# Altium integrated library Hoovic_Library.IntLib: 194 symbols (continued)
## Header 9
designator P?  (value not drawn)
连接器, 9-Pin
footprint CONN-TH_9P-2.54-DIR
footprint CONN-TH_9P-P2.00_PH-8AW
pins: 1, 2, 3, 4, 5, 6, 7, 8, 9

## Header 10
designator P?  (value not drawn)
连接器, 10-Pin
footprint BatCon_10PIN_2.5mm
footprint CONN-TH_10P-2.54-DIR
footprint BatCon_10PIN_2.5mm_MAL
pins: 1, 2, 3, 4, 5, 6, 7, 8, 9, 10

## Header 11
designator P?  (value not drawn)
连接器, 11-Pin
footprint BatCon_11PIN_2.5mm
footprint BatCon_11PIN_2.5mm_MAL
pins: 1, 2, 3, 4, 5, 6, 7, 8, 9, 10, 11

## Header 12
designator P?  (value not drawn)
连接器, 12-Pin
footprint BatCon_12PIN_2.5mm
footprint BatCon_12PIN_2.5mm_MAL
pins: 1, 2, 3, 4, 5, 6, 7, 8, 9, 10, 11, 12

## Header 20
designator P?  (value not drawn)
连接器, 20-Pin
footprint CONN-TH_20P-2.54-DIR
pins: 1, 2, 3, 4, 5, 6, 7, 8, 9, 10, 11, 12, 13, 14, 15, 16, 17, 18, 19, 20

## HF2150-1A-5DE
designator K?  (value not drawn)
继电器 5VDC (277VAC , 30VDC) Max Power Relay
footprint RELAY-TH_HF2150-1A
footprint RELAY-TH_YX202-S-105DM
pins: 1, 2, 3, 4

## HT7533
designator U?
电源芯片 Vin=30V Vout=3.3V 100mA
footprint SOT-89
pins: 1 GND, 2 IN, 3 OUT

## Inductor
designator L?, comment 10nH 300mA ±5%  (value not drawn)
电感
footprint R0402
footprint R0603
footprint R0805
pins: 1, 2

## Inductor Iron
designator L?, comment 220uH 1.5A ±20%  (value not drawn)
功率电感
footprint IND2520
footprint IND3015
footprint IND1207
footprint IND5020
footprint T050125 (7mm_Inductor)
footprint IND6045
footprint IND8065
footprint IND_BD17-D10-P5.5MM
pins: 1, 2

## KSZ8081RNBIA-TR
designator U?
10BASE-T/100BASE-TX Physical Layer / Transceiver
footprint QFN32-0.5_5x5MM
pins: 0 PADDLE, 1 GND, 2 VDD_1.2, 3 VDDA_3.3, 4 RXM, 5 RXP, 6 TXM, 7 TXP, 8 XO, 9 XI, 10 REXT, 11 MDIO, 12 MDC, 13 PHYAD0, 14 PHYAD1, 15 RXD1/PHYAD2, 16 RXD0/DUPLEX, 17 VDDIO, 18 CRS_DV/CONFIG2, 19 REF_CLK/B-CAST_OFF, 20 RXER/ISO, 21 INTRP/NAND_TREE#, 22 NC1, 23 TXEN, 24 TXD0, 25 TXD1, 26 NC2, 27 NC3, 28 CONFIG0, 29 CONFIG1, 30 LED0/NWAYEN, 31 LED1/SPEED, 32 RST#

## LED
designator D?, comment BLUE
Typical INFRARED GaAs LED
footprint SOD-323-LED
footprint SOD-523-LED
footprint SMD-2835-LED
footprint SMD-3528UWC-LED
footprint LED-SMD_2P_XL_3020UBC
pins: 1 K, 2 A

## LED-2W
designator D?, comment 15-22
2位数码管
footprint LED-TH_DPY-L20-W16
pins: 1 +, 2 +, 3 +, 4 +, 5 +, 6 -, 7 -, 8 -, 9 -, 10 -

## LED-4P
designator D?, comment 15-22
双色灯
footprint LED-SMD_1206
pins: 1 +, 2 -, 3 +, 4 -

## LED-4P_RGB
designator D?, comment XL-1615RGBC
三色灯
footprint LED-SMD_XL-1615RGBC
pins: 1 R-, 2 G-, 3 COM+, 4 B-

## LED-WS2812C
designator D？, comment WS2812C
RGB
footprint LED-SMD_WS2812C
pins: 1 DO, 2 GND, 3 DI, 4 VDD

## LED_0603
designator D?, comment 0603 BLUE
LED_0603
footprint SOD-523-LED
pins: 1 K, 2 A

## LED_0805
designator D?, comment 0805 BLUE
LED_0805
footprint SOD-323-LED
pins: 1 K, 2 A

## LED_TH
designator D?, comment 0603 BLUE
LED_插件
footprint LED-TH_BD5.0-P2.54-FD
pins: 1 K, 2 A

## LKS620
designator U?
高集成度低功耗降压型恒压芯片
footprint SOP-8_150mil
pins: 1 GND, 2 Vout, 3 NC, 4 VCC, 5 DRAIN, 6 NC, 7 CS, 8 IC_GND

## LM358
designator U?  (value not drawn)
运算放大器 Single Supply Dual Operational Amplifiers
footprint SOP-8_150mil
part A pins: 1, 2, 3, 4 GND, 8 VCC
part B pins: 4 GND, 5, 6, 7, 8 VCC

## LM2596
designator U?  (value not drawn)
3.0A, 150kHz, Step-Down Switching Regulator
footprint TO-263-5
pins: 0 GND, 1 VIN, 2 OUT, 3 GND, 4 FDB, 5 EN#

## Logo
designator Logo?  (value not drawn)
PCB板上丝印Logo
footprint HoovicLogo_8mm
footprint UL_LOGO_3MM
text: HoovicLogo

## LWP040
designator U?
40Kpa气压计
footprint MSP40-GDR
footprint MSP40-GSF
pins: 1 GND, 2 Vout+, 3 Vin+, 4 NC, 5 Vout-, 6 GND

## MARK_1MM
designator MARK?, comment MARK_POINT  (value not drawn)
PCB板上Mark点
footprint MARK_1MM
pins: 1

## ME321
designator U?
1MHz，轨到轨I/O，低功耗运算放大器
footprint SOT-23-5
pins: 1, 2 GND, 3, 4, 5 VDD

## MHT150CRWDT
designator D?
1206封装的红白黄色LED
footprint LED-SMD_4P-L3.2-W1.6-RD_MHT150CRWDT
pins: 1 -, 2 -, 3 +, 4 +
text: R; W

## MicroSD_Socket
designator P?
自弹式 MicroSD卡(TF卡) 卡座
footprint TF-SMD_TF-01A
pins: 1 DAT2, 2 CD/DAT3, 3 CMD, 4 VDD, 5 CLK, 6 VSS, 7 DAT0, 8 DAT1, 9 CD, 10 GND, 11 GND, 12 GND, 13 GND

## MM3Z4V7
designator ZD?
稳压二极管/ 稳压值(标称值)：4.7V
footprint SOD-323F_L2.0-W1.6-LS2.5-RD
pins: 1 K, 2 A

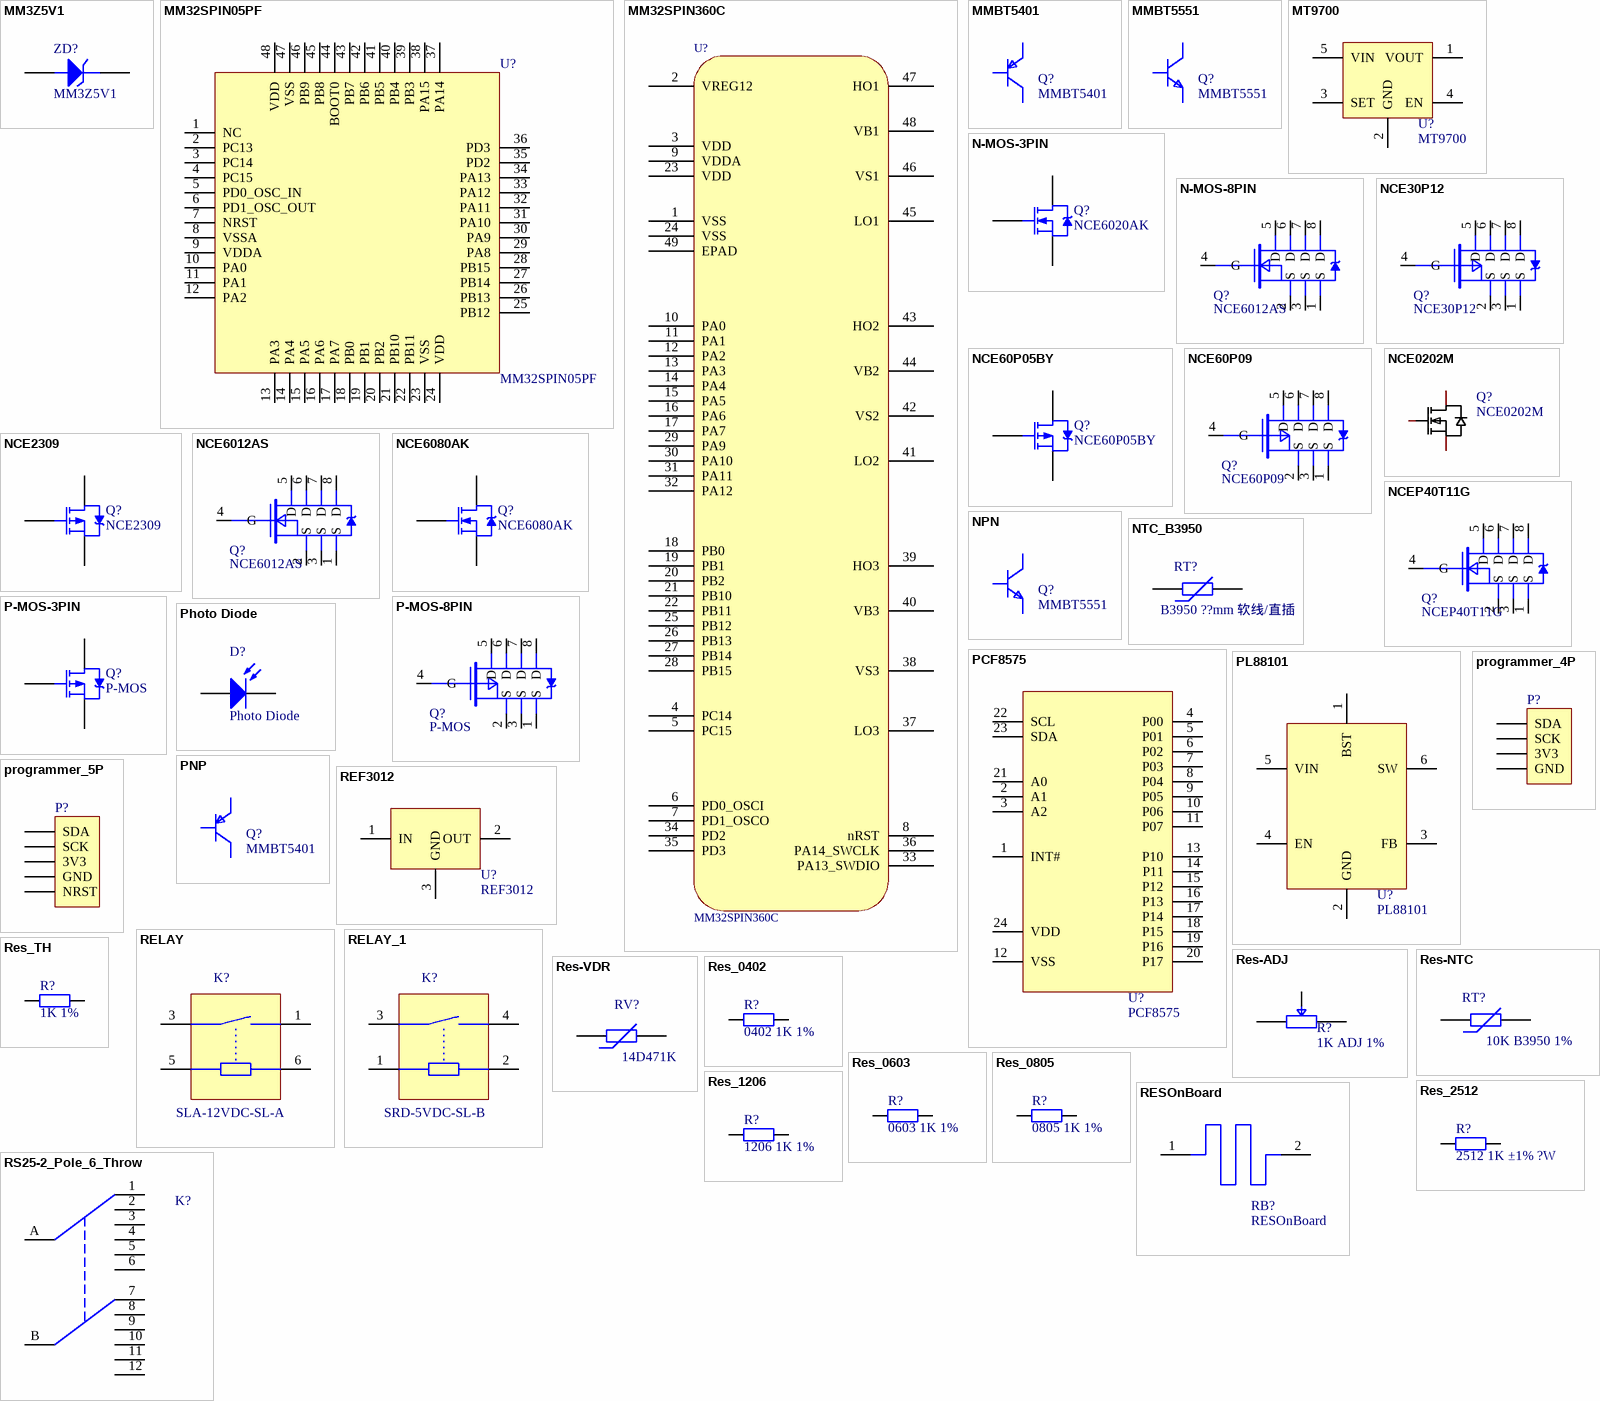
[diagram p3: symbols MM3Z5V1 to RS25-2_Pole_6_Throw]

## MM3Z5V1
designator ZD?
稳压二极管/ 稳压值(标称值)：5.1V
footprint SOD-323F_L2.0-W1.6-LS2.5-RD
pins: 1 K, 2 A

## MM32SPIN05PF
designator U?
灵动微电子MM32控制MCU
footprint LQFP-48
pins: 1 NC, 2 PC13, 3 PC14, 4 PC15, 5 PD0_OSC_IN, 6 PD1_OSC_OUT, 7 NRST, 8 VSSA, 9 VDDA, 10 PA0, 11 PA1, 12 PA2, 13 PA3, 14 PA4, 15 PA5, 16 PA6, 17 PA7, 18 PB0, 19 PB1, 20 PB2, 21 PB10, 22 PB11, 23 VSS, 24 VDD, 25 PB12, 26 PB13, 27 PB14, 28 PB15, 29 PA8, 30 PA9, 31 PA10, 32 PA11, 33 PA12, 34 PA13, 35 PD2, 36 PD3, 37 PA14, 38 PA15, 39 PB3, 40 PB4, 41 PB5, 42 PB6, 43 PB7, 44 BOOT0, 45 PB8, 46 PB9, 47 VSS, 48 VDD

## MM32SPIN360C
designator U?
灵动微电机控制MCU
footprint QFN48-0.5-7X7MM
pins: 1 VSS, 2 VREG12, 3 VDD, 4 PC14, 5 PC15, 6 PD0_OSCI, 7 PD1_OSCO, 8 nRST, 9 VDDA, 10 PA0, 11 PA1, 12 PA2, 13 PA3, 14 PA4, 15 PA5, 16 PA6, 17 PA7, 18 PB0, 19 PB1, 20 PB2, 21 PB10, 22 PB11, 23 VDD, 24 VSS, 25 PB12, 26 PB13, 27 PB14, 28 PB15, 29 PA9, 30 PA10, 31 PA11, 32 PA12, 33 PA13_SWDIO, 34 PD2, 35 PD3, 36 PA14_SWCLK, 37 LO3, 38 VS3, 39 HO3, 40 VB3, 41 LO2, 42 VS2, 43 HO2, 44 VB2, 45 LO1, 46 VS1, 47 HO1, 48 VB1, 49 EPAD

## MMBT5401
designator Q?
PNP三极管
footprint SOT-23-3
pins: 1 B, 2 E, 3 C

## MMBT5551
designator Q?
NPN三极管
footprint SOT-23-3
pins: 1 B, 2 E, 3 C

## MT9700
designator U?
80mΩ,Adjustable Fast Response / Current-Limited Power-Distribution Switch
footprint SOT-23-5
pins: 1 VOUT, 2 GND, 3 SET, 4 EN, 5 VIN

## N-MOS-3PIN
designator Q?, comment NCE6020AK
N-Channel Power MOSFET with 3 Pin
footprint SOT-23-3-MOSFET
footprint TO-252-2
pins: 1 G, 2 D, 3 S

## N-MOS-8PIN
designator Q?, comment NCE6012AS
N-Channel Power MOSFET with 8 Pin
footprint PMPAK_L5.1-W6.2-P1.27-BL
footprint SOP-8_150mil
footprint DFN3.3X3.3-8L
pins: 1 S, 2 S, 3 S, 4 G, 5 D, 6 D, 7 D, 8 D

## NCE30P12
designator Q?
P-MOSFET with 8 Pin Vdss=30V Id=12A Vgs(th)=3V
footprint SOP-8_150mil
pins: 1 S, 2 S, 3 S, 4 G, 5 D, 6 D, 7 D, 8 D

## NCE60P05BY
designator Q?
P-MOSFET with 3 Pin Vdss=60V Id=5A Vgs(th)=1.5V
footprint SOT-23-3-MOSFET
pins: 1 G, 2 D, 3 S

## NCE60P09
designator Q?
P-MOSFET with 8 Pin Vdss=60V Id=9A Vgs(th)=2.6V
footprint SOP-8_150mil
pins: 1 S, 2 S, 3 S, 4 G, 5 D, 6 D, 7 D, 8 D

## NCE0202M
designator Q?
Manufacturer: NCE(无锡新洁能); Add into BOM: yes; Type: N沟道; Drain Source Voltage (Vdss): 200V; Continuous Drain Current (Id): 2A; Power Dissipation (Pd): 1.5W; Drain Source On Resistance (RDS(on)@Vgs,Id): 520mΩ@10V,2A; Gate Threshold Voltage (Vgs(th)@Id): 1.8V@250uA; Total Gate Charge (Qg@Vgs): 12nC@10V; Input Capacitance (Ciss@Vds): 580pF@25V; Reverse Transfer Capacitance (Crss@Vds): 3pF@25V; Name: NCE0202M; Symbol: NCE0202M; Device: NCE0202M; LCSC Part Name: N沟道 200V 2A; Supplier Part: C2686539; Manufacturer Part: NCE0202M; Supplier Footprint: SOT-89-3; JLCPCB Part Class: Extended Part; Datasheet: https://atta.szlcsc.com/upload/public/pdf/source/20210315/C2686539_296E07E2B517E9DEEBF2A06B2F3B3751.pdf; Supplier: LCSC; Convert to PCB: yes; Operating Temperature: -55℃~+150℃@(Tj)
footprint SOT-89-3_L4.5-W2.5-P1.50-LS4.2-BR
pins: 1 G, 2 D, 3 S

## NCE2309
designator Q?
P-MOSFET with 3 Pin Vdss=60V Id=1.6A Vgs(th)=2V
footprint SOT-23-3-MOSFET
pins: 1 G, 2 D, 3 S

## NCE6012AS
designator Q?
N-MOSFET with 8 Pin Vdss=60V Id=12A Vgs(th)=1.8V
footprint SOP-8_150mil
pins: 1 S, 2 S, 3 S, 4 G, 5 D, 6 D, 7 D, 8 D

## NCE6080AK
designator Q?
N-MOSFET with 3 Pin Vdss=60V Id=80A Vgs(th)=4V
footprint TO-252-2
pins: 1 G, 2 D, 3 S

## NCEP40T11G
designator Q?
N-MOSFET with 8 Pin Vdss=40V Id=110A Vgs(th)=2.2V
footprint PMPAK_L5.1-W6.2-P1.27-BL
pins: 1 S, 2 S, 3 S, 4 G, 5 D, 6 D, 7 D, 8 D

## NPN
designator Q?, comment MMBT5551
NPN三极管
footprint SOT-23-3
footprint SOT-23-3-PADS
pins: 1 B, 2 E, 3 C

## NTC_B3950
designator RT?, comment B3950 ??mm 软线/直插
热敏电阻B3950 10K 1%
footprint CONN-TH_2P-2.0-NTC
footprint NTC_20D
pins: 1, 2

## P-MOS-3PIN
designator Q?, comment P-MOS
P-Channel Power MOSFET with 3 Pin
footprint TO-252-2
footprint SOT-23-3-MOSFET
pins: 1 G, 2 D, 3 S

## P-MOS-8PIN
designator Q?, comment P-MOS
P-Channel Power MOSFET with 8 Pin
footprint PMPAK_L5.1-W6.2-P1.27-BL
footprint SOP-8_150mil
pins: 1 S, 2 S, 3 S, 4 G, 5 D, 6 D, 7 D, 8 D

## PCF8575
designator U?
Remote 16-bit I/O expander for I2C-bus
footprint TSSOP-24_5.3MM
pins: 1 INT#, 2 A1, 3 A2, 4 P00, 5 P01, 6 P02, 7 P03, 8 P04, 9 P05, 10 P06, 11 P07, 12 VSS, 13 P10, 14 P11, 15 P12, 16 P13, 17 P14, 18 P15, 19 P16, 20 P17, 21 A0, 22 SCL, 23 SDA, 24 VDD

## Photo Diode
designator D?
光敏二极管
footprint LED-TH_BD5.0-P2.54-FD
pins: 1 K, 2 A

## PL88101
designator U?
60V, 600mA Monolithic Step-Down Switching Regulator
footprint SOT-23-6
pins: 1 BST, 2 GND, 3 FB, 4 EN, 5 VIN, 6 SW

## PNP
designator Q?, comment MMBT5401
PNP三极管
footprint SOT-23-3
pins: 1 B, 2 E, 3 C

## programmer_4P
designator P?, comment NC  (value not drawn)
下载口 4-Pin
footprint programmer_4P
pins: 1 SDA, 2 SCK, 3 3V3, 4 GND

## programmer_5P
designator P?, comment NC  (value not drawn)
下载口 5-Pin
footprint programmer_5P
pins: 1 SDA, 2 SCK, 3 3V3, 4 GND, 5 NRST

## REF3012
designator U?
50-ppm/°C Max, 50-μA, CMOS Voltage Reference in SOT-23-3
footprint SOT-23-3
pins: 1 IN, 2 OUT, 3 GND

## RELAY
designator K?, comment SLA-12VDC-SL-A
继电器
footprint RYL_SLA-12VDC
pins: 1, 3, 5, 6

## RELAY_1
designator K?, comment SRD-5VDC-SL-B
继电器
footprint RELAY-TH_SRD-5VDC-SL-B
footprint RELAY-TH_YX202-S-105DM
pins: 1, 2, 3, 4

## Res-ADJ
designator R?, comment 1K ADJ 1%
电位器
footprint RES-ADJ-WH148
footprint RES-ADJ-TH_3P-L9.5-W4.9-P2.50-L_3296W
pins: 1, 2, 3

## Res-NTC
designator RT?, comment 10K B3950 1%
Varistor (Voltage-Sensitive Resistor)
footprint R0603
footprint CONN-TH_2P-2.0-NTC
footprint NTC_20D
pins: 1, 2

## Res-VDR
designator RV?, comment 14D471K
压敏电阻
footprint 14D471K
pins: 1, 2

## Res_0402
designator R?, comment 0402 1K 1%
贴片电阻
footprint R0402
pins: 1, 2

## Res_0603
designator R?, comment 0603 1K 1%
贴片电阻
footprint R0603
pins: 1, 2

## Res_0805
designator R?, comment 0805 1K 1%
贴片电阻
footprint R0805
footprint R0805 - PADS
pins: 1, 2

## Res_1206
designator R?, comment 1206 1K 1%
贴片电阻
footprint R1206
footprint R1206 - PADS
pins: 1, 2

## Res_2512
designator R?, comment 2512 1K ±1% ?W
贴片电阻
footprint R2512
pins: 1, 2

## Res_TH
designator R?, comment 1K 1%
插件电阻
footprint RES-TH-D4.0-L9.0
pins: 1, 2

## RESOnBoard
designator RB?  (net tie, no BOM)
板上蛇形走线用此器件连接
footprint RESOnBoard (For single point Grounding)
pins: 1 GND, 2 AGND

## RS25-2_Pole_6_Throw
designator K?  (value not drawn)
双刀六掷波段开关
footprint RS25-2-6
pins: 1, 2, 3, 4, 5, 6, 7, 8, 9, 10, 11, 12, A, B

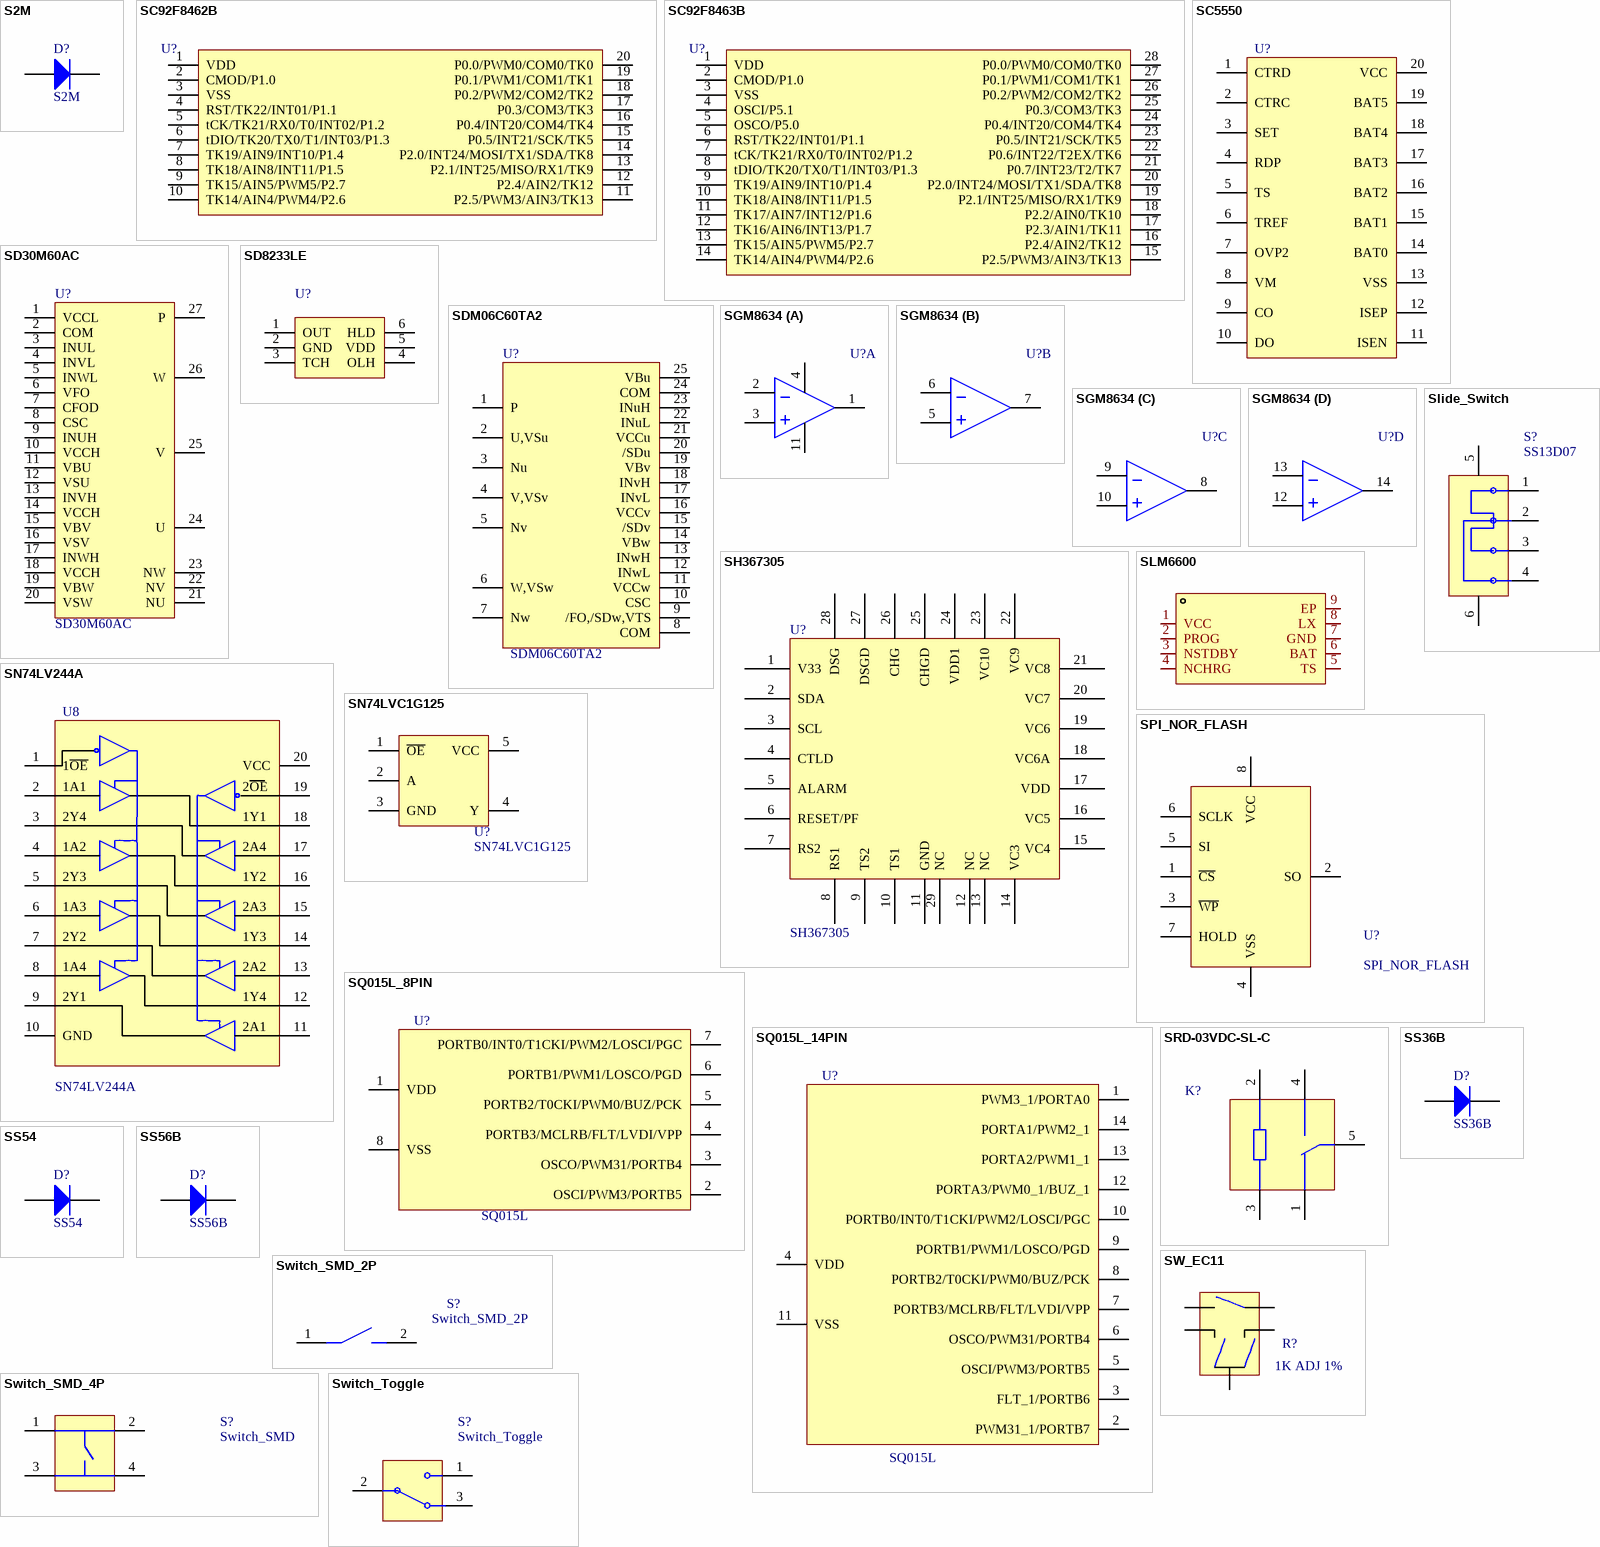
[diagram p4: symbols S2M to Switch_Toggle]

## S2M
designator D?
贴片普通二极管
footprint SMA
pins: 1 K, 2 A

## SC92F8462B
designator U?  (value not drawn)
赛元51单片机
footprint TSSOP-20
pins: 1 VDD, 2 CMOD/P1.0, 3 VSS, 4 RST/TK22/INT01/P1.1, 5 tCK/TK21/RX0/T0/INT02/P1.2, 6 tDIO/TK20/TX0/T1/INT03/P1.3, 7 TK19/AIN9/INT10/P1.4, 8 TK18/AIN8/INT11/P1.5, 9 TK15/AIN5/PWM5/P2.7, 10 TK14/AIN4/PWM4/P2.6, 11 P2.5/PWM3/AIN3/TK13, 12 P2.4/AIN2/TK12, 13 P2.1/INT25/MISO/RX1/TK9, 14 P2.0/INT24/MOSI/TX1/SDA/TK8, 15 P0.5/INT21/SCK/TK5, 16 P0.4/INT20/COM4/TK4, 17 P0.3/COM3/TK3, 18 P0.2/PWM2/COM2/TK2, 19 P0.1/PWM1/COM1/TK1, 20 P0.0/PWM0/COM0/TK0

## SC92F8463B
designator U?  (value not drawn)
赛元51单片机
footprint TSSOP-28
pins: 1 VDD, 2 CMOD/P1.0, 3 VSS, 4 OSCI/P5.1, 5 OSCO/P5.0, 6 RST/TK22/INT01/P1.1, 7 tCK/TK21/RX0/T0/INT02/P1.2, 8 tDIO/TK20/TX0/T1/INT03/P1.3, 9 TK19/AIN9/INT10/P1.4, 10 TK18/AIN8/INT11/P1.5, 11 TK17/AIN7/INT12/P1.6, 12 TK16/AIN6/INT13/P1.7, 13 TK15/AIN5/PWM5/P2.7, 14 TK14/AIN4/PWM4/P2.6, 15 P2.5/PWM3/AIN3/TK13, 16 P2.4/AIN2/TK12, 17 P2.3/AIN1/TK11, 18 P2.2/AIN0/TK10, 19 P2.1/INT25/MISO/RX1/TK9, 20 P2.0/INT24/MOSI/TX1/SDA/TK8, 21 P0.7/INT23/T2/TK7, 22 P0.6/INT22/T2EX/TK6, 23 P0.5/INT21/SCK/TK5, 24 P0.4/INT20/COM4/TK4, 25 P0.3/COM3/TK3, 26 P0.2/PWM2/COM2/TK2, 27 P0.1/PWM1/COM1/TK1, 28 P0.0/PWM0/COM0/TK0

## SC5550
designator U?  (value not drawn)
2~5 节电池保护IC
footprint TSSOP-20
pins: 1 CTRD, 2 CTRC, 3 SET, 4 RDP, 5 TS, 6 TREF, 7 OVP2, 8 VM, 9 CO, 10 DO, 11 ISEN, 12 ISEP, 13 VSS, 14 BAT0, 15 BAT1, 16 BAT2, 17 BAT3, 18 BAT4, 19 BAT5, 20 VCC

## SD30M60AC
designator U?
三相全桥驱动
footprint DIP-27H
pins: 1 VCCL, 2 COM, 3 INUL, 4 INVL, 5 INWL, 6 VFO, 7 CFOD, 8 CSC, 9 INUH, 10 VCCH, 11 VBU, 12 VSU, 13 INVH, 14 VCCH, 15 VBV, 16 VSV, 17 INWH, 18 VCCH, 19 VBW, 20 VSW, 21 NU, 22 NV, 23 NW, 24 U, 25 V, 26 W, 27 P

## SD8233LE
designator U?  (value not drawn)
首鼎单按键触摸开关IC
footprint SOT-23-6
pins: 1 OUT, 2 GND, 3 TCH, 4 OLH, 5 VDD, 6 HLD

## SDM06C60TA2
designator U?
三相全桥驱动
footprint DIP-25B
pins: 1 P, 2 U,VSu, 3 Nu, 4 V,VSv, 5 Nv, 6 W,VSw, 7 Nw, 8 COM, 9 /FO,/SDw,VTS, 10 CSC, 11 VCCw, 12 INwL, 13 INwH, 14 VBw, 15 /SDv, 16 VCCv, 17 INvL, 18 INvH, 19 VBv, 20 /SDu, 21 VCCu, 22 INuL, 23 INuH, 24 COM, 25 VBu

## SGM8634
designator U?  (value not drawn)
运算放大器
footprint SOP-14_150mil
part A pins: 1, 2, 3, 4 VCC, 11 GND
part B pins: 5, 6, 7
part C pins: 8, 9, 10
part D pins: 12, 13, 14

## SH367305
designator U?
中颖电池管理芯片AFE
footprint QFN28-0.5-5X5MM
pins: 1 V33, 2 SDA, 3 SCL, 4 CTLD, 5 ALARM, 6 RESET/PF, 7 RS2, 8 RS1, 9 TS2, 10 TS1, 11 GND, 12 NC, 13 NC, 14 VC3, 15 VC4, 16 VC5, 17 VDD, 18 VC6A, 19 VC6, 20 VC7, 21 VC8, 22 VC9, 23 VC10, 24 VDD1, 25 CHGD, 26 CHG, 27 DSGD, 28 DSG, 29 NC

## Slide_Switch
designator S?, comment SS13D07
滑动档位开关SS13D07
footprint Slide_Switch_SS13D07
pins: 1, 2, 3, 4, 5, 6

## SLM6600
designator U?  (value not drawn)
锂电池管理; Manufacturer: 无锡松朗微; Add into BOM: yes; Name: SLM6600; Symbol: SLM6600; Device: SLM6600; LCSC Part Name: SLM6600; Supplier Part: C130316; Manufacturer Part: SLM6600; Supplier Footprint: SOP-8-EP-150mil; JLCPCB Part Class: Extended Part; Datasheet: https://atta.szlcsc.com/upload/public/pdf/source/20200723/C130316_33CFDDBAEF8892C90734B89DFA84F834.pdf; Supplier: LCSC; Convert to PCB: yes
footprint SOP-8_L4.9-W3.9-P1.27-LS6.0-BL-EP
pins: 1 VCC, 2 PROG, 3 NSTDBY, 4 NCHRG, 5 TS, 6 BAT, 7 GND, 8 LX, 9 EP

## SN74LV244A
designator U8
逻辑转换芯片
footprint TSSOP-20
pins: 1 1~{OE}, 2 1A1, 3 2Y4, 4 1A2, 5 2Y3, 6 1A3, 7 2Y2, 8 1A4, 9 2Y1, 10 GND, 11 2A1, 12 1Y4, 13 2A2, 14 1Y3, 15 2A3, 16 1Y2, 17 2A4, 18 1Y1, 19 2~{OE}, 20 VCC
text: 2OE

## SN74LVC1G125
designator U?
SN74LVC1G125 Single Bus Buffer Gate With 3-State Output
footprint SOT-23-5
pins: 1 ~{OE}, 2 A, 3 GND, 4 Y, 5 VCC

## SPI_NOR_FLASH
designator U?
SPI NOR Flash 器件 SOP-8封装
footprint SOP-8_150mil
pins: 1 ~{CS}, 2 SO, 3 ~{WP}, 4 VSS, 5 SI, 6 SCLK, 7 HOLD, 8 VCC

## SQ015L_8PIN
designator U?, comment SQ015L
芯圣SQ015L_SOP-8封装
footprint SOP-8_150mil
pins: 1 VDD, 2 OSCI/PWM3/PORTB5, 3 OSCO/PWM31/PORTB4, 4 PORTB3/MCLRB/FLT/LVDI/VPP, 5 PORTB2/T0CKI/PWM0/BUZ/PCK, 6 PORTB1/PWM1/LOSCO/PGD, 7 PORTB0/INT0/T1CKI/PWM2/LOSCI/PGC, 8 VSS

## SQ015L_14PIN
designator U?, comment SQ015L
芯圣SQ015L_SOP-14封装
footprint SOP-14_150mil
pins: 1 PWM3_1/PORTA0, 2 PWM31_1/PORTB7, 3 FLT_1/PORTB6, 4 VDD, 5 OSCI/PWM3/PORTB5, 6 OSCO/PWM31/PORTB4, 7 PORTB3/MCLRB/FLT/LVDI/VPP, 8 PORTB2/T0CKI/PWM0/BUZ/PCK, 9 PORTB1/PWM1/LOSCO/PGD, 10 PORTB0/INT0/T1CKI/PWM2/LOSCI/PGC, 11 VSS, 12 PORTA3/PWM0_1/BUZ_1, 13 PORTA2/PWM1_1, 14 PORTA1/PWM2_1

## SRD-03VDC-SL-C
designator K?  (value not drawn)
3VDC (250VAC) Max Power Relay
footprint SRD-03VDC-SL-C
pins: 1, 2, 3, 4, 5

## SS36B
designator D?
贴片肖特基二极管
footprint SMB
pins: 1 K, 2 A

## SS54
designator D?
贴片肖特基二极管
footprint SMA
pins: 1 K, 2 A

## SS56B
designator D?
贴片肖特基二极管
footprint SMB
pins: 1 K, 2 A

## SW_EC11
designator R?, comment 1K ADJ 1%
旋转编码器
footprint SW-TH_EC11
pins: 1, 2, 3, 4, 5

## Switch_SMD_2P
designator S?
2PIN按键开关
footprint SW-SMD-7.5*4.5*6.5W
pins: 1, 2

## Switch_SMD_4P
designator S?, comment Switch_SMD
4PIN按键开关
footprint SMD-4_6x6
footprint SMD-4_5.1x5.1
pins: 1, 2, 3, 4

## Switch_Toggle
designator S?
单路拨动钮子开关
footprint SW-TH_1MS1T1B1M1QES-5
pins: 1, 2, 3

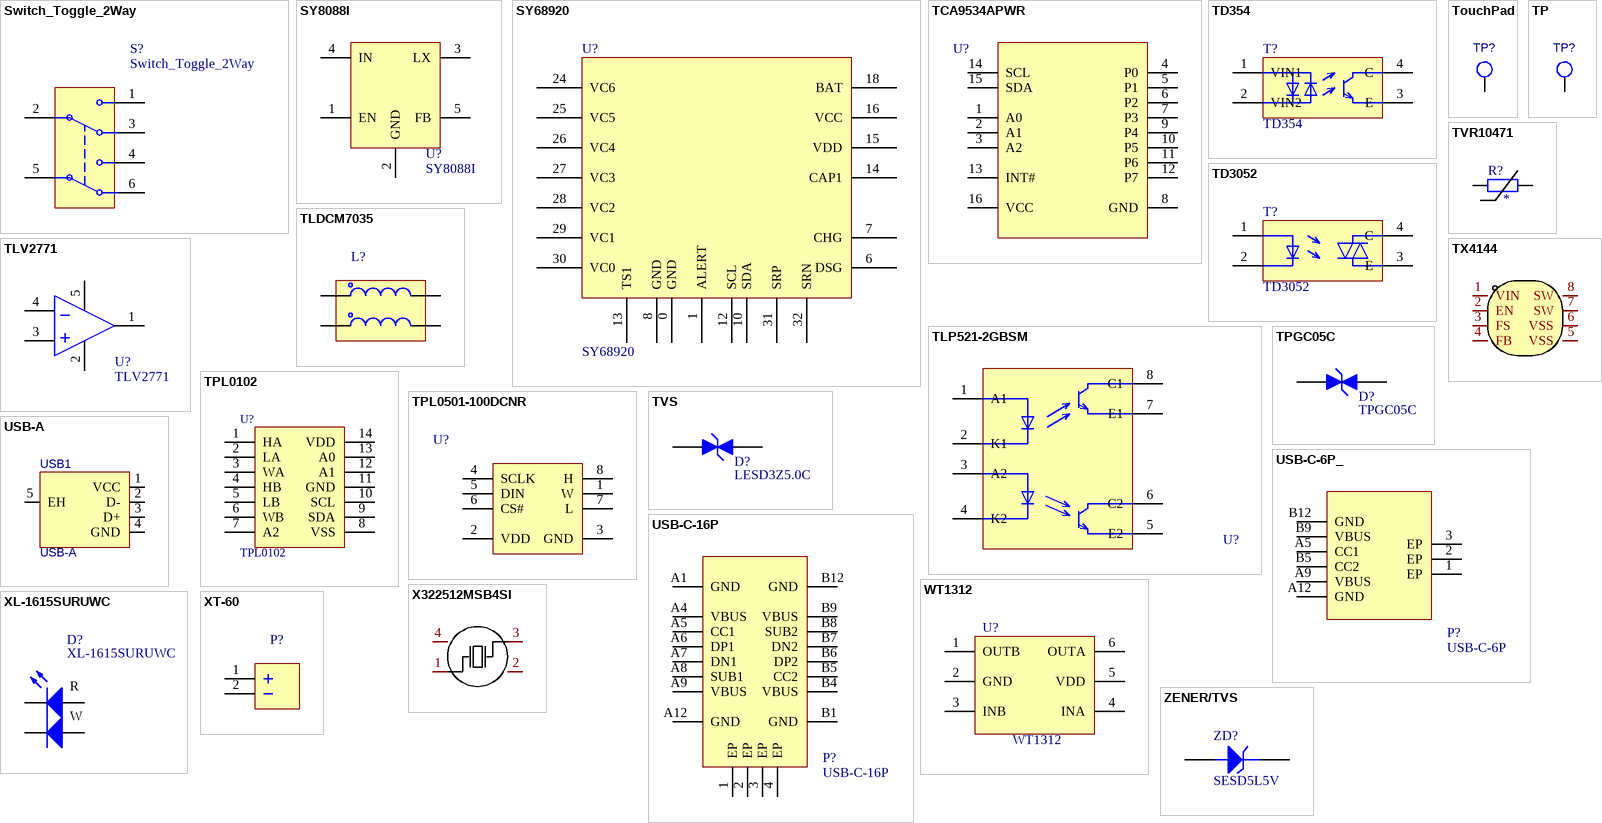
[diagram p5: symbols Switch_Toggle_2Way to ZENER/TVS]

## Switch_Toggle_2Way
designator S?
双路拨动钮子开关
footprint SW-TH_MSS22D18GX
pins: 1, 2, 3, 4, 5, 6

## SY8088I
designator U?
High Efficiency, 1.5MHz, 1A / Synchronous Step Down Regulator
footprint SOT-23-5
pins: 1 EN, 2 GND, 3 LX, 4 IN, 5 FB

## SY68920
designator U?
矽力杰电池管理芯片AFE
footprint QFN32-0.5_5x5MM
pins: 0 GND, 1 ALERT, 6 DSG, 7 CHG, 8 GND, 10 SDA, 12 SCL, 13 TS1, 14 CAP1, 15 VDD, 16 VCC, 18 BAT, 24 VC6, 25 VC5, 26 VC4, 27 VC3, 28 VC2, 29 VC1, 30 VC0, 31 SRP, 32 SRN

## TCA9534APWR
designator U?  (value not drawn)
Low Voltage 8-Bit I2C and SMBUS Low-Power I/O Expander With Interrupt Output and Configuration Registers
footprint TSSOP-16
pins: 1 A0, 2 A1, 3 A2, 4 P0, 5 P1, 6 P2, 7 P3, 8 GND, 9 P4, 10 P5, 11 P6, 12 P7, 13 INT#, 14 SCL, 15 SDA, 16 VCC

## TD354
designator T?
光耦-光电晶体管输出
footprint SOP-4
pins: 1 VIN1, 2 VIN2, 3 E, 4 C

## TD3052
designator T?
可控硅控制器
footprint SOP-4
pins: 1 VIN1, 2 VIN2, 3 E, 4 C

## TLDCM7035
designator L?  (value not drawn)
韬略科技共模抑制电感
footprint TLDCM7035
pins: 1, 2, 3, 4

## TLP521-2GBSM
designator U?  (value not drawn)
双路低速光耦
footprint SMD-8_2.54MM
pins: 1 A1, 2 K1, 3 A2, 4 K2, 5 E2, 6 C2, 7 E1, 8 C1

## TLV2771
designator U?
Single, 5.5-V, 5.1-MHz, high slew rate (10.5-V/μs) operational amplifier
footprint SOT-23-5
pins: 1, 2 GND, 3, 4, 5 VDD

## TouchPad
designator TP?  (value not drawn)
触摸芯片弹簧连接焊盘
footprint TOUCHPAD_6MM
footprint TOUCHPAD_5MM
footprint TOUCHPAD_10MM
pins: 1

## TP
designator TP?, comment TestPoint  (value not drawn)
测试点
footprint TESTPOINT-30MIL
footprint TESTPOINT-70MIL
footprint TESTPOINT-50MIL
pins: 1

## TPGC05C
designator D?
静电放电(ESD)保护器件
footprint SOD-323_L1.8-W1.3-LS2.5-BI
pins: 1 C, 2 A

## TPL0102
designator U?
I2C接口256抽头数字电位器
footprint TSSOP-14
pins: 1 HA, 2 LA, 3 WA, 4 HB, 5 LB, 6 WB, 7 A2, 8 VSS, 9 SDA, 10 SCL, 11 GND, 12 A1, 13 A0, 14 VDD

## TPL0501-100DCNR
designator U?  (value not drawn)
Digital Potentiometer
footprint R-PDSO-G8
pins: 1 W, 2 VDD, 3 GND, 4 SCLK, 5 DIN, 6 CS#, 7 L, 8 H

## TVR10471
designator R?
压敏电阻
footprint TVR10471
pins: 1, 2

## TVS
designator D?, comment LESD3Z5.0C
双向TVS
footprint SOD-323_L1.8-W1.3-LS2.5-BI
footprint SOD-123
footprint SOD-523
footprint SMA
footprint SMB
pins: 1 C, 2 A

## TX4144
designator U?  (value not drawn)
降压型 输入6V~60V 1.5A; Manufacturer: XDS(芯鼎盛); Add into BOM: yes; Number of Outputs: 1; Input Voltage: 6V~0V; Switching Frequency: 140kHz；450kHz; Quiescent Current (Iq): 150uA; Name: TX4144; Symbol: TX4144; Device: TX4144; LCSC Part Name: 降压型 Vin=6V~0V 1.5A; Supplier Part: C4153685; Manufacturer Part: TX4144; Supplier Footprint: SOP-8; JLCPCB Part Class: Extended Part; Datasheet: https://atta.szlcsc.com/upload/public/pdf/source/20220706/F01FB6E18B2A790E98A19A1C52DE2D08.pdf; Supplier: LCSC; Convert to PCB: yes; Function: 降压型; Synchronous Rectification: -; Output Type: -; Topology: -; Output Voltage: -; Output Current (Max): 1.5A; Operating Temperature: -40℃~+85℃@(Ta)
footprint SOP-8_150mil
pins: 1 VIN, 2 EN, 3 FS, 4 FB, 5 VSS, 6 VSS, 7 SW, 8 SW

## USB-A
designator USB1
4PIN USB接口
footprint USB-A-SMD
footprint USB-A-180
pins: 1 VCC, 2 D-, 3 D+, 4 GND, 5 EH

## USB-C-6P_
designator P?, comment USB-C-6P
6Pin USB Type-C 接口
footprint USB-C-SMD_KH-TYPE-C-6P -L
pins: 1 EP, 2 EP, 3 EP, A5 CC1, A9 VBUS, A12 GND, B5 CC2, B9 VBUS, B12 GND

## USB-C-16P
designator P?
16Pin USB Type-C 接口，支持USB 2.0与USB PD应用
footprint USB-C-SMD_KH-TYPE-C-16P
footprint USB-C-SMD_KH-TYPE-C-16P -L
footprint USB-C-DIP_KH-TYPE-C-16P
pins: 1 EP, 2 EP, 3 EP, 4 EP, A1 GND, A4 VBUS, A5 CC1, A6 DP1, A7 DN1, A8 SUB1, A9 VBUS, A12 GND, B1 GND, B4 VBUS, B5 CC2, B6 DP2, B7 DN2, B8 SUB2, B9 VBUS, B12 GND

## WT1312
designator U?
功放芯片
footprint SOT-23-6
pins: 1 OUTB, 2 GND, 3 INB, 4 INA, 5 VDD, 6 OUTA

## X322512MSB4SI
designator X?  (value not drawn)
Manufacturer: YXC(扬兴晶振); Name: 12MHz; Add into BOM: yes; Crystal Type: 贴片无源晶振; Value: 12MHz; Frequency Tolerance: ±10ppm; Frequency Stability: ±30ppm; Load Capacitance: 20pF; Symbol: X322512MSB4SI; Device: X322512MSB4SI; LCSC Part Name: 12MHz ±10ppm 20pF; Supplier Part: C9002; Manufacturer Part: X322512MSB4SI; Supplier Footprint: SMD3225-4P; JLCPCB Part Class: Basic Part; Datasheet: https://atta.szlcsc.com/upload/public/pdf/source/20210329/C112971_1F611BDC486E193C1706F6D8EB5AA189.pdf; Supplier: LCSC; Convert to PCB: yes; Operating Temperature: -40℃~+85℃
footprint OSC-SMD_4P-L3.2-W2.5-BL
pins: 1 OSC1, 2 GND, 3 OSC2, 4 GND

## XL-1615SURUWC
designator D?
0603封装的红白黄色LED
footprint LED-SMD_4P-L1.6-W1.5-RD_XL-1615SURUWC
pins: 1 -, 2 +, 3 -, 4 +
text: R; W

## XT-60
designator P?  (value not drawn)
XT60 额定30A连接器
footprint XT60-F
footprint CONN-TH_XT60PW-M
pins: 1 P, 2 N

## ZENER/TVS
designator ZD?, comment SESD5L5V
稳压管/单向TVS管
footprint SOD-323F_L2.0-W1.6-LS2.5-RD
footprint SOD-123
footprint SOD-523
footprint SMA
footprint SMB
pins: 1 K, 2 A